# Altium schematic symbol library Sang_library.SchLib: 1607 symbols (part 14 of 15)
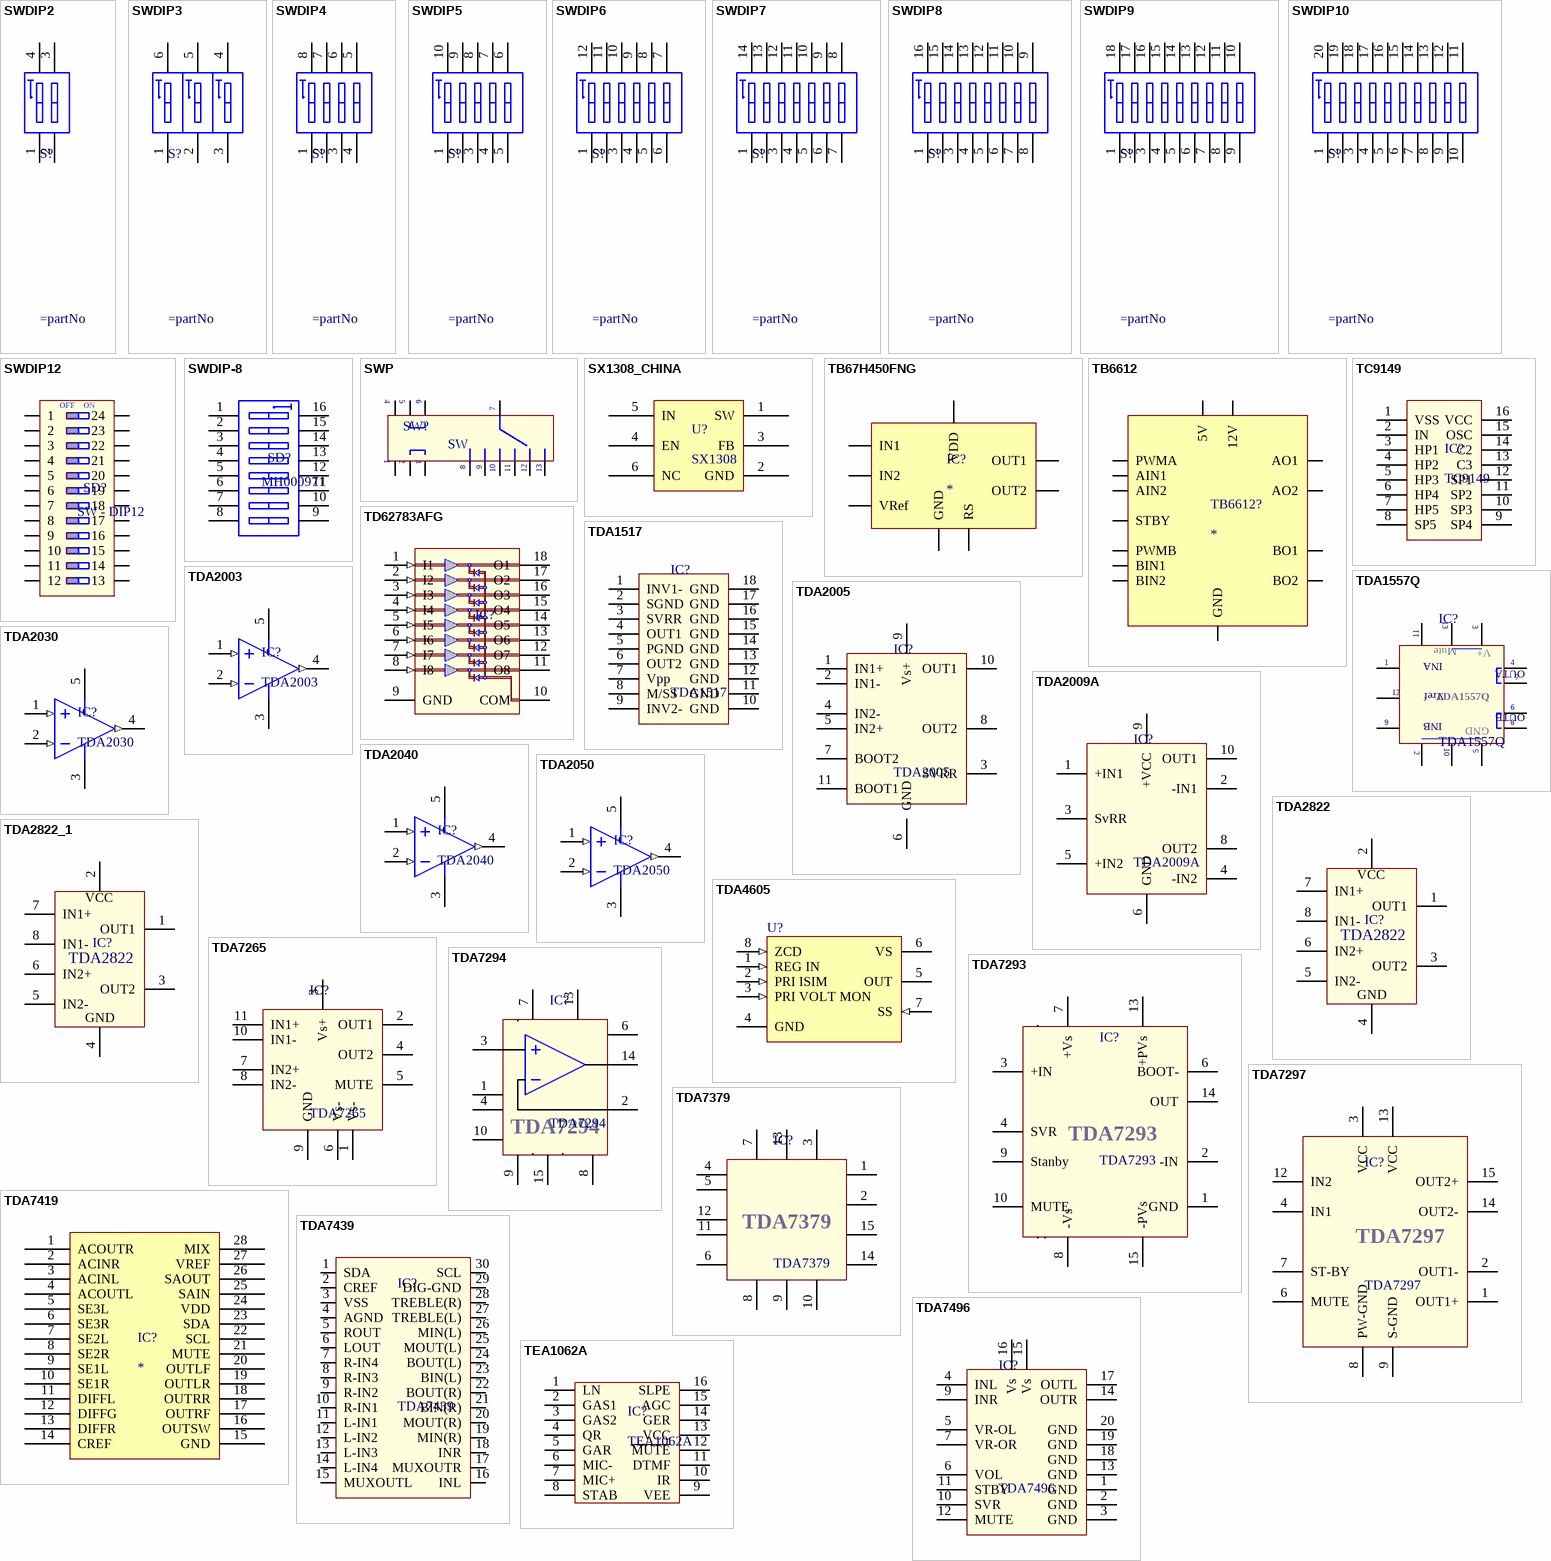
[diagram p110: symbols SWDIP2 to TEA1062A]

## SWDIP3
designator S?
WS-DITV 2.54 mm small compact THT flat actuator with top tape; Manufacturer: Wurth Elektronik; Part No.: 418127160901; ComponentLink1 Description: Manufacturer; ComponentLink2 Description: Datasheet; Pole: 01; Created Date: Dec.2015; ComponentLink1URL: http://www.we-online.com; ComponentLink2URL: http://katalog.we-online.de/em/datasheet/4181271609xx.pdf; Created by: Baojun Chen
footprint SW-DIP3 (03p, 2.54mm Pitch, Horizontal, IC Type, THT, raised Actuator, black, without Tape, Tube)
footprint SW-DIP3-1 (03p, 2.54mm Pitch, Horizontal, Box Type, THT, flat Actuator, red, without Tape, Tube)
pins: 1, 2, 3, 4, 5, 6

## SWDIP4
designator S?
WS-DITV 2.54 mm small compact THT flat actuator with top tape; Manufacturer: Wurth Elektronik; Part No.: 418127160904; ComponentLink1 Description: Manufacturer; ComponentLink2 Description: Datasheet; Pole: 04; Created Date: Dec.2015; ComponentLink1URL: http://www.we-online.com; ComponentLink2URL: http://katalog.we-online.de/em/datasheet/4181271609xx.pdf; Created by: Baojun Chen
footprint SW-DIP4 (04p, 2.54mm Pitch, Horizontal, Box Type, THT, flat Actuator, red, without Tape, Tube)
footprint SW-DIP4-1 (08p, 2.54mm Pitch, Horizontal, IC Type, THT, raised Actuator, black, without Tape, Tube)
pins: 1, 2, 3, 4, 5, 6, 7, 8

## SWDIP5
designator S?
WS-DITV 2.54 mm small compact THT flat actuator with top tape; Manufacturer: Wurth Elektronik; Part No.: 418127160905; ComponentLink1 Description: Manufacturer; ComponentLink2 Description: Datasheet; Pole: 05; Created Date: Dec.2015; ComponentLink1URL: http://www.we-online.com; ComponentLink2URL: http://katalog.we-online.de/em/datasheet/4181271609xx.pdf; Created by: Baojun Chen
footprint SW-DIP5 (05p, 2.54mm Pitch, Horizontal, Box Type, THT, flat Actuator, red, without Tape, Tube)
pins: 1, 2, 3, 4, 5, 6, 7, 8, 9, 10

## SWDIP6
designator S?
WS-DITV 2.54 mm small compact THT flat actuator with top tape; Manufacturer: Wurth Elektronik; Part No.: 418127160906; ComponentLink1 Description: Manufacturer; ComponentLink2 Description: Datasheet; Pole: 06; Created Date: Dec.2015; ComponentLink1URL: http://www.we-online.com; ComponentLink2URL: http://katalog.we-online.de/em/datasheet/4181271609xx.pdf; Created by: Baojun Chen
footprint SW-DIP6 (06p, 2.54mm Pitch, Horizontal, Box Type, THT, flat Actuator, red, without Tape, Tube)
pins: 1, 2, 3, 4, 5, 6, 7, 8, 9, 10, 11, 12

## SWDIP7
designator S?
WS-DITV 2.54 mm small compact THT flat actuator with top tape; Manufacturer: Wurth Elektronik; Part No.: 418127160907; ComponentLink1 Description: Manufacturer; ComponentLink2 Description: Datasheet; Pole: 07; Created Date: Dec.2015; ComponentLink1URL: http://www.we-online.com; ComponentLink2URL: http://katalog.we-online.de/em/datasheet/4181271609xx.pdf; Created by: Baojun Chen
footprint SW-DIP7 (07p, 2.54mm Pitch, Horizontal, IC Type, THT, raised Actuator, black, without Tape, Tube)
footprint SW-DIP7-1 (07p, 2.54mm Pitch, Horizontal, Box Type, THT, flat Actuator, red, without Tape, Tube)
pins: 1, 2, 3, 4, 5, 6, 7, 8, 9, 10, 11, 12, 13, 14

## SWDIP8
designator S?
WS-DITV 2.54 mm small compact THT flat actuator with top tape; Manufacturer: Wurth Elektronik; Part No.: 418127160908; ComponentLink1 Description: Manufacturer; ComponentLink2 Description: Datasheet; Pole: 08; Created Date: Dec.2015; ComponentLink1URL: http://www.we-online.com; ComponentLink2URL: http://katalog.we-online.de/em/datasheet/4181271609xx.pdf; Created by: Baojun Chen
footprint SW-DIP8 (16 PIN, W 300mil, Pin to pin 100mil For Switch)
pins: 1, 2, 3, 4, 5, 6, 7, 8, 9, 10, 11, 12, 13, 14, 15, 16

## SWDIP9
designator S?
WS-DITV 2.54 mm small compact THT flat actuator with top tape; Manufacturer: Wurth Elektronik; Part No.: 418127160909; ComponentLink1 Description: Manufacturer; ComponentLink2 Description: Datasheet; Pole: 09; Created Date: Dec.2015; ComponentLink1URL: http://www.we-online.com; ComponentLink2URL: http://katalog.we-online.de/em/datasheet/4181271609xx.pdf; Created by: Baojun Chen
footprint SW-DIP9-1 (09p, 2.54mm Pitch, Horizontal, Box Type, THT, flat Actuator, red, without Tape, Tube)
footprint SW-DIP9 (09p, 2.54mm Pitch, Horizontal, IC Type, THT, raised Actuator, black, without Tape, Tube)
pins: 1, 2, 3, 4, 5, 6, 7, 8, 9, 10, 11, 12, 13, 14, 15, 16, 17, 18

## SWDIP10
designator S?
WS-DITV 2.54 mm small compact THT flat actuator with top tape; Manufacturer: Wurth Elektronik; Part No.: 418127160910; ComponentLink1 Description: Manufacturer; ComponentLink2 Description: Datasheet; Pole: 10; Created Date: Dec.2015; ComponentLink1URL: http://www.we-online.com; ComponentLink2URL: http://katalog.we-online.de/em/datasheet/4181271609xx.pdf; Created by: Baojun Chen
footprint SW-DIP10-1 (10p, 2.54mm Pitch, Horizontal, IC Type, THT, raised Actuator, black, without Tape, Tube)
footprint SW-DIP10 (10p, 2.54mm Pitch, Horizontal, Box Type, THT, flat Actuator, red, without Tape, Tube)
pins: 1, 2, 3, 4, 5, 6, 7, 8, 9, 10, 11, 12, 13, 14, 15, 16, 17, 18, 19, 20

## SWDIP12
designator SD?, comment SW - DIP12
DIP Switch, 12 Position, SPST; Value: SW - DIP12
footprint SW-DIP12 (12p, 2.54mm Pitch, Horizontal, Box Type, THT, flat Actuator, red, without Tape, Tube)
pins: 1, 2, 3, 4, 5, 6, 7, 8, 9, 10, 11, 12, 13, 14, 15, 16, 17, 18, 19, 20, 21, 22, 23, 24
text: OFF; ON

## SWDIP-8
designator SD?, comment MH000971
Cắm; Value: Switch Số 8P ( Công Tắc Bit 8P)
footprint DIP16/W0.3 KEY (16 PIN, W 300mil, Pin to pin 100mil)
simulation model dpsw8 (Spice Subcircuit)
pins: 1 A1, 2 A2, 3 A3, 4 A4, 5 A5, 6 A6, 7 A7, 8 A8, 9 B8, 10 B7, 11 B6, 12 B5, 13 B4, 14 B3, 15 B2, 16 B1

## SWP
designator SW?, comment SW
Switch Power; Value: SW Power
footprint SWP (SW Power)
pins: 1, 2, 3, 4, 5, 6, 7, 8, 9, 10, 11, 12, 13

## SX1308_CHINA
designator U?, comment SX1308
footprint SOT23-6
pins: 1 SW (power), 2 GND (power), 3 FB (power), 4 EN (power), 5 IN (power), 6 NC (power)

## TB67H450FNG
designator IC?
footprint HSOP8 (SOIC, 8-Leads, Body 4.9x3.9mm, Pitch 1.27mm, IPC High Density)
pins: 1 GND, 2 IN2, 3 IN1, 4 VRef, 5 VDD, 6 OUT1, 7 RS, 8 OUT2

## TB6612
designator TB6612?
footprint TB6612
pins: 5V, 12V, AIN1, AIN2, AO1, AO2, BIN1, BIN2, BO1, BO2, GND, PWMA, PWMB, STBY

## TC9149
designator IC?
footprint DIP16
footprint SO16 (SOIC, 16-Leads, Body 9.90x3.91mm, Pitch 1.27mm, IPC Medium Density)
pins: 1 VSS, 2 IN, 3 HP1, 4 HP2, 5 HP3, 6 HP4, 7 HP5, 8 SP5, 9 SP4, 10 SP3, 11 SP2, 12 SP1, 13 C3, 14 C2, 15 OSC, 16 VCC

## TD62783AFG
designator IC?  (value not drawn)
High-Voltage, High-Current Darlington Array; Value: TD62783AFG
footprint DIP18 (DIP; 18 Leads; Row Spacing 7.62 mm; Pitch 2.54 mm)
footprint SO18 (SOIC, 18-Leads, Body 11.6x7.5mm, Pitch 1.27mm, IPC High Density)
pins: 1 I1 (in), 2 I2 (in), 3 I3 (in), 4 I4 (in), 5 I5 (in), 6 I6 (in), 7 I7 (in), 8 I8 (in), 9 GND (power), 10 COM, 11 O8 (oc), 12 O7 (oc), 13 O6 (oc), 14 O5 (oc), 15 O4 (oc), 16 O3 (oc), 17 O2 (oc), 18 O1 (oc)

## TDA1517
designator IC?
Value: TDA1557Q
footprint DIP18 (DIP; 18 Leads; Row Spacing 7.62 mm; Pitch 2.54 mm)
pins: 1 INV1-, 2 SGND, 3 SVRR, 4 OUT1, 5 PGND, 6 OUT2, 7 Vpp, 8 M/SS, 9 INV2-, 10 GND, 11 GND, 12 GND, 13 GND, 14 GND, 15 GND, 16 GND, 17 GND, 18 GND

## TDA1557Q
designator IC?
2 x 22 W BTL stereo car radio power amplifier with speaker protection; Value: TDA1557Q
footprint DIP13
pins: 1 IN1, 2 GND, 3 V+, 4 OUT1A, 5 GND, 6 OUT1B, 7 OUT2A, 8 OUT2B, 9 IN2, 10 GND, 11 Mute, 12 Vref, 13 V+
text: INA; OUTA; OUTB; INB

## TDA2003
designator IC?
10W CAR RADIO AUDIO AMPLIFIER; Value: TDA2003
footprint DIP5
footprint DIP5-T
pins: 1 IN+ (in), 2 IN- (in), 3 V- (power), 4 OUT (out), 5 V+ (power)

## TDA2005
designator IC?
Value: TDA1557Q
footprint DIP11
pins: 1 IN1+, 2 IN1-, 3 SVRR, 4 IN2-, 5 IN2+, 6 GND, 7 BOOT2, 8 OUT2, 9 Vs+, 10 OUT1, 11 BOOT1

## TDA2009A
designator IC?
2 x 10 W BTL stereo car radio power amplifier with speaker protection; Value: TDA1557Q
footprint DIP11
pins: 1 +IN1, 2 -IN1, 3 SvRR, 4 -IN2, 5 +IN2, 6 GND, 8 OUT2, 9 +VCC, 10 OUT1

## TDA2030
designator IC?
14W Hi-Fi AUDIO AMPLIFIER; Value: TDA2030
footprint DIP5
pins: 1 IN+ (in), 2 IN- (in), 3 V- (power), 4 OUT (out), 5 V+ (power)

## TDA2040
designator IC?
14W Hi-Fi AUDIO AMPLIFIER; Value: TDA2030
footprint DIP5
pins: 1 IN+ (in), 2 IN- (in), 3 V- (power), 4 OUT (out), 5 V+ (power)

## TDA2050
designator IC?
Value: TDA2030
footprint DIP5
pins: 1 IN+ (in), 2 IN- (in), 3 V- (power), 4 OUT (out), 5 V+ (power)

## TDA2822
designator IC?, comment MH001571  (value not drawn)
Cắm; Value: TDA2822 12V
footprint DIP8/W0.3 (8 PIN, W 300mil, Pin to pin 100mil)
pins: 1 OUT1, 2 VCC, 3 OUT2, 4 GND "VCC", 5 IN2- "VCC", 6 IN2+ "VCC", 7 IN1+ "VCC", 8 IN1- "VCC"

## TDA2822_1
designator IC?, comment TDA2822  (value not drawn)
Dual Low Voltage Power Amplifire
footprint DIP8
footprint SO8
pins: 1 OUT1, 2 VCC, 3 OUT2, 4 GND "VCC", 5 IN2- "VCC", 6 IN2+ "VCC", 7 IN1+ "VCC", 8 IN1- "VCC"

## TDA4605
designator U?
Control Circuit for Switch Mode Power Supplie using MOS Transistors; Published: 24-Aug-2001; LatestRevisionDate: 06-Jun-2005; LatestRevisionNote: Stylized 3D Model Added.; DatasheetVersion: Apr-1996; PackageReference: DIP8; Publisher: Altium Limited; PackageDescription: DIP; 8 Leads; Row Spacing 7.62 mm; Pitch 2.54 mm; Code_JEDEC: MO-001-AN; ComponentLink1Description: Manufacturer Link; ComponentLink1URL: http://www.st.com/; ComponentLink2Description: Datasheet; ComponentLink2URL: http://www.st.com/stonline/products/literature/ds/9775/tda4605.pdf
footprint DIP8
footprint SO8 (SOIC, 8-Leads, Body 4.9x3.9mm, Pitch 1.27mm, IPC High Density)
pins: 1 REG IN (in), 2 PRI ISIM (in), 3 PRI VOLT MON (in), 4 GND (power), 5 OUT (power), 6 VS (power), 7 SS (in), 8 ZCD (in)

## TDA7265
designator IC?
Value: TDA1557Q
footprint DIP11
pins: 1 Vs-, 2 OUT1, 3 Vs+, 4 OUT2, 5 MUTE, 6 Vs-, 7 IN2+, 8 IN2-, 9 GND, 10 IN1-, 11 IN1+

## TDA7293
designator IC?
100V - 100W DMOS AUDIO AMPLIFIER WITH MUTE/ST-BY; Value: TDA1557Q
footprint DIP15SL2
footprint DIP15
pins: 1 GND, 2 -IN, 3 +IN, 4 SVR, 5 NC, 6 BOOT-, 7 +Vs, 8 -Vs, 9 Stanby, 10 MUTE, 11 NC, 12 NC, 13 +PVs, 14 OUT, 15 -PVs

## TDA7294
designator IC?
100V - 100W DMOS AUDIO AMPLIFIER WITH MUTE/ST-BY; Value: TDA1557Q
footprint DIP15SL2
footprint DIP15
pins: 1, 2, 3, 4, 5 NC, 6, 7, 8, 9, 10, 11 NC, 12 NC, 13, 14, 15

## TDA7297
designator IC?
100V - 100W DMOS AUDIO AMPLIFIER WITH MUTE/ST-BY; Value: TDA1557Q
footprint DIP15SL2
footprint DIP15
pins: 1 OUT1+, 2 OUT1-, 3 VCC, 4 IN1, 6 MUTE, 7 ST-BY, 8 PW-GND, 9 S-GND, 12 IN2, 13 VCC, 14 OUT2-, 15 OUT2+

## TDA7379
designator IC?
100V - 100W DMOS AUDIO AMPLIFIER WITH MUTE/ST-BY; Value: TDA1557Q
footprint DIP15SL2
footprint DIP15
pins: 1, 2, 3, 4, 5, 6, 7, 8, 9, 10, 11, 12, 13, 14, 15

## TDA7419
designator IC?
footprint SO28 (SOIC, 28-Leads, Body 18.00x7.50mm, Pitch 1.27mm, IPC Medium Density)
pins: 1 ACOUTR, 2 ACINR, 3 ACINL, 4 ACOUTL, 5 SE3L, 6 SE3R, 7 SE2L, 8 SE2R, 9 SE1L, 10 SE1R, 11 DIFFL, 12 DIFFG, 13 DIFFR, 14 CREF, 15 GND, 16 OUTSW, 17 OUTRF, 18 OUTRR, 19 OUTLR, 20 OUTLF, 21 MUTE, 22 SCL, 23 SDA, 24 VDD, 25 SAIN, 26 SAOUT, 27 VREF, 28 MIX

## TDA7439
designator IC?
100V - 100W DMOS AUDIO AMPLIFIER WITH MUTE/ST-BY; Value: TDA1557Q
footprint SDIP30
pins: 1 SDA, 2 CREF, 3 VSS, 4 AGND, 5 ROUT, 6 LOUT, 7 R-IN4, 8 R-IN3, 9 R-IN2, 10 R-IN1, 11 L-IN1, 12 L-IN2, 13 L-IN3, 14 L-IN4, 15 MUXOUTL, 16 INL, 17 MUXOUTR, 18 INR, 19 MIN(R), 20 MOUT(R), 21 BIN(R), 22 BOUT(R), 23 BIN(L), 24 BOUT(L), 25 MOUT(L), 26 MIN(L), 27 TREBLE(L), 28 TREBLE(R), 29 DIG-GND, 30 SCL

## TDA7496
designator IC?
Value: TDA1557Q
footprint DIP20 (DIP 20, 20 PIN, W 300mil, Pin to pin 100mil)
pins: 1 GND, 2 GND, 3 GND, 4 INL, 5 VR-OL, 6 VOL, 7 VR-OR, 9 INR, 10 SVR, 11 STBY, 12 MUTE, 13 GND, 14 OUTR, 15 Vs, 16 Vs, 17 OUTL, 18 GND, 19 GND, 20 GND

## TEA1062A
designator IC?
Low voltage transmission circuits with dialler interface; Creat by: VanDungEvn@Gmail.com
footprint DIP16
footprint SO16 (SOIC, 16-Leads, Body 9.90x3.91mm, Pitch 1.27mm, IPC Medium Density)
pins: 1 LN, 2 GAS1, 3 GAS2, 4 QR, 5 GAR, 6 MIC-, 7 MIC+, 8 STAB, 9 VEE, 10 IR, 11 DTMF, 12 ~{MUTE}, 13 VCC, 14 GER, 15 AGC, 16 SLPE

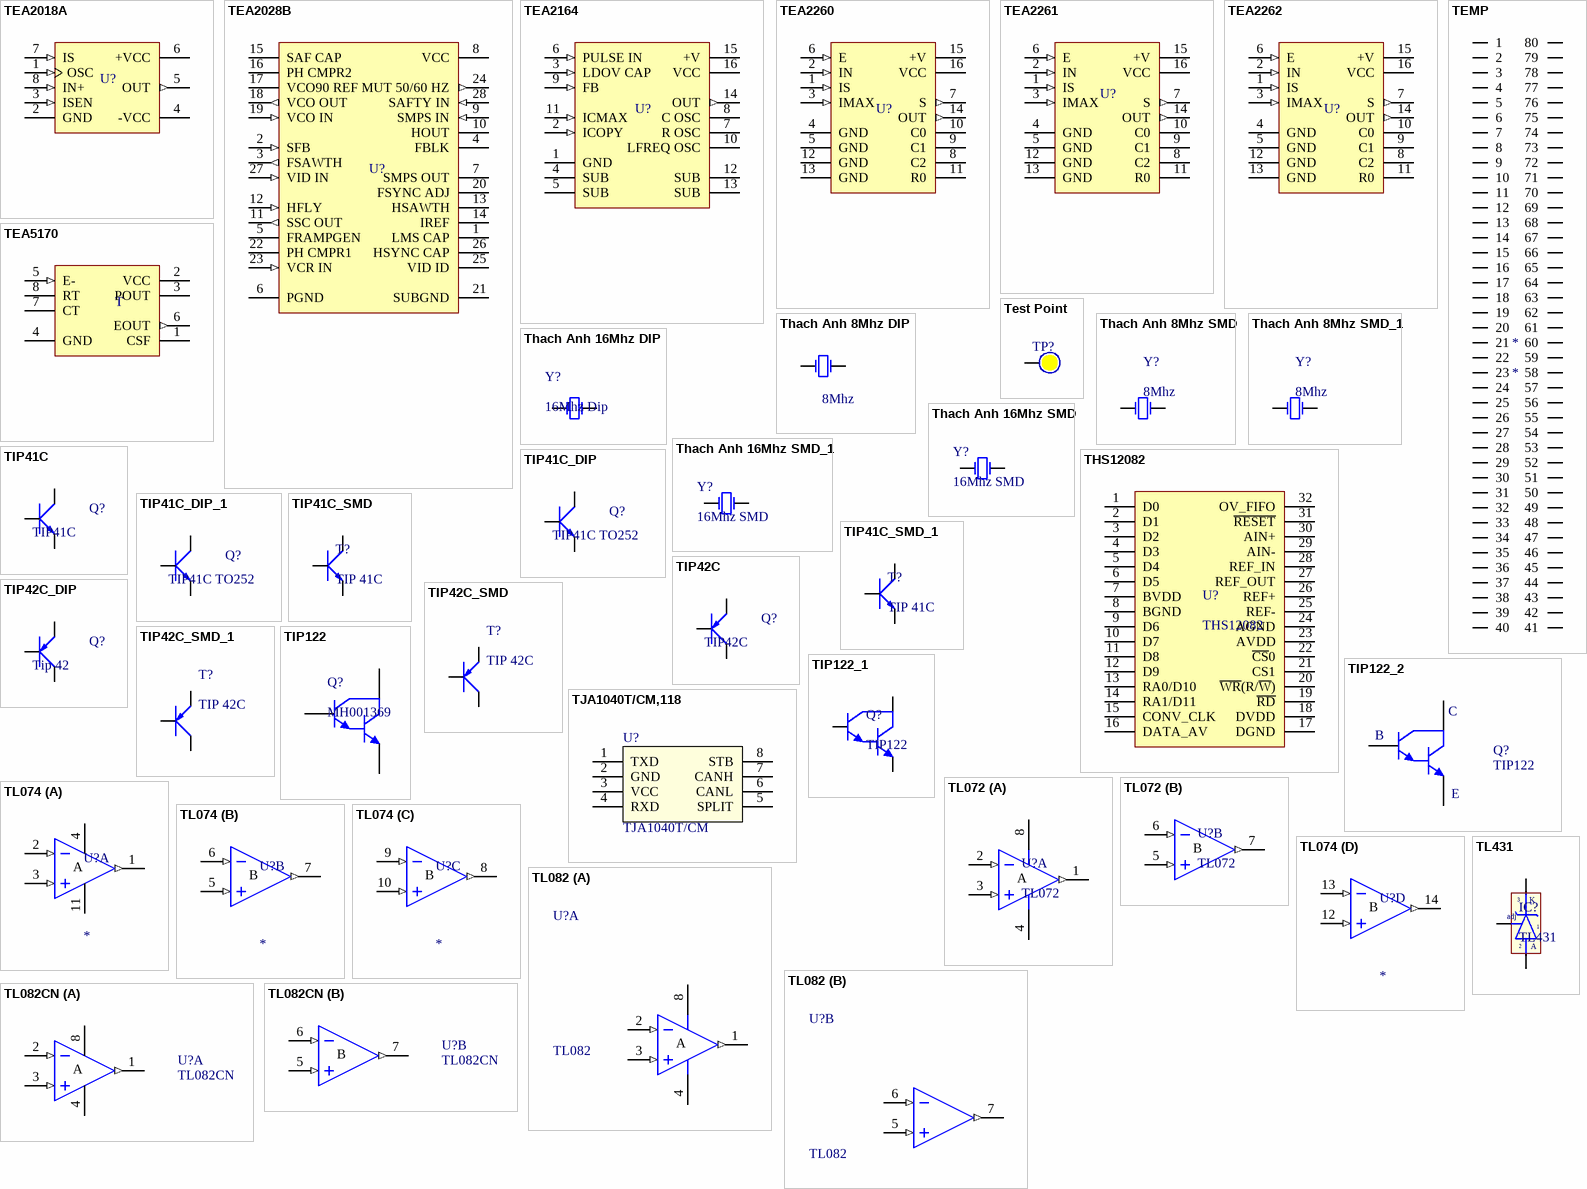
[diagram p91: symbols TEA2018A to TL431]

## TEA2018A
designator U?
Current Mode Switching Power Supply Control Circuit; Published: 24-Aug-2001; LatestRevisionDate: 06-Jun-2005; LatestRevisionNote: Stylized 3D Model Added.; DatasheetVersion: May-1993; PackageReference: DIP8; Publisher: Altium Limited; PackageDescription: DIP; 8 Leads; Row Spacing 7.62 mm; Pitch 2.54 mm; Code_JEDEC: MO-001-AN; ComponentLink1Description: Manufacturer Link; ComponentLink1URL: http://www.st.com/
footprint DIP8 (DIP; 8 Leads; Row Spacing 7.62 mm; Pitch 2.54 mm)
footprint SO8 (SOIC, 8-Leads, Body 4.9x3.9mm, Pitch 1.27mm, IPC High Density)
pins: 1 OSC (in), 2 GND (power), 3 ISEN (in), 4 -VCC (power), 5 OUT (out), 6 +VCC (power), 7 IS (in), 8 IN+ (in)

## TEA2028B
designator U?
Color TV Scanning and Power Supply Processor; Published: 24-Aug-2001; LatestRevisionDate: 06-Jun-2005; LatestRevisionNote: Stylized 3D Model Added.; DatasheetVersion: Aug-1993; PackageVersion: Jan-2003; PackageReference: PDIP28; Publisher: Altium Limited; PackageDescription: DIP; 28 Leads; Row Spacing 15.24 mm; Pitch 2.54 mm; ComponentLink1Description: Manufacturer Link; ComponentLink1URL: http://www.st.com/
footprint DIP28/W0.6 (DIP28/W.600, Pin to pin 100mil)
pins: 1 LMS CAP, 2 SFB (in), 3 FSAWTH (out), 4 FBLK (oc), 5 FRAMPGEN, 6 PGND (power), 7 SMPS OUT (oe), 8 VCC (power), 9 SMPS IN (in), 10 HOUT (oc), 11 SSC OUT (out), 12 HFLY (in), 13 HSAWTH, 14 IREF, 15 SAF CAP, 16 PH CMPR2, 17 VCO90 REF, 18 VCO OUT (out), 19 VCO IN (in), 20 FSYNC ADJ, 21 SUBGND (power), 22 PH CMPR1, 23 VCR IN (in), 24 MUT 50/60 HZ (out), 25 VID ID, 26 HSYNC CAP, 27 VID IN (in), 28 SAFTY IN (in)

## TEA2164
designator U?
Switch Mode Power Supply Primary Circuit; Published: 24-Aug-2001; LatestRevisionDate: 06-Jun-2005; LatestRevisionNote: Stylized 3D Model Added.; DatasheetVersion: Dec-1992; PackageVersion: Apr-1996; PackageReference: DIP16; Publisher: Altium Limited; PackageDescription: DIP; 16 Leads; Row Spacing 7.62 mm; Pitch 2.54 mm; ComponentLink1Description: Manufacturer Link; ComponentLink1URL: http://www.st.com/
footprint DIP16 (DIP; 16 Leads; Row Spacing 7.62 mm; Pitch 2.54 mm)
pins: 1 GND (power), 2 ICOPY (in), 3 LDOV CAP (in), 4 SUB (power), 5 SUB (power), 6 PULSE IN (in), 7 R OSC, 8 C OSC, 9 FB (in), 10 LFREQ OSC, 11 ICMAX (in), 12 SUB (power), 13 SUB (power), 14 OUT (out), 15 +V (power), 16 VCC (power)

## TEA2260
designator U?
Switch Mode Power Supply Controller; Published: 24-Aug-2001; LatestRevisionDate: 06-Jun-2005; LatestRevisionNote: Stylized 3D Model Added.; DatasheetVersion: Jun-1992; PackageVersion: Apr-1996; PackageReference: DIP16; Publisher: Altium Limited; PackageDescription: DIP; 16 Leads; Row Spacing 7.62 mm; Pitch 2.54 mm; ComponentLink1Description: Manufacturer Link; ComponentLink1URL: http://www.st.com/; ComponentLink2Description: Datasheet; ComponentLink2URL: http://www.st.com/stonline/products/literature/ds/9953/tea2261.pdf
footprint DIP16 (DIP; 16 Leads; Row Spacing 7.62 mm; Pitch 2.54 mm)
pins: 1 IS (in), 2 IN (in), 3 IMAX (in), 4 GND (power), 5 GND (power), 6 E (in), 7 S (out), 8 C2, 9 C1, 10 C0, 11 R0, 12 GND (power), 13 GND (power), 14 OUT (out), 15 +V (power), 16 VCC (power)

## TEA2261
designator U?
Switch Mode Power Supply Controller; Published: 24-Aug-2001; LatestRevisionDate: 06-Jun-2005; LatestRevisionNote: Stylized 3D Model Added.; DatasheetVersion: Jun-1992; PackageVersion: Apr-1996; PackageReference: DIP16; Publisher: Altium Limited; PackageDescription: DIP; 16 Leads; Row Spacing 7.62 mm; Pitch 2.54 mm; ComponentLink1Description: Manufacturer Link; ComponentLink1URL: http://www.st.com/; ComponentLink2Description: Datasheet; ComponentLink2URL: http://www.st.com/stonline/products/literature/ds/9953/tea2261.pdf
footprint DIP16 (DIP; 16 Leads; Row Spacing 7.62 mm; Pitch 2.54 mm)
pins: 1 IS (in), 2 IN (in), 3 IMAX (in), 4 GND (power), 5 GND (power), 6 E (in), 7 S (out), 8 C2, 9 C1, 10 C0, 11 R0, 12 GND (power), 13 GND (power), 14 OUT (out), 15 +V (power), 16 VCC (power)

## TEA2262
designator U?
Switch Mode Power Supply Controller; Published: 24-Aug-2001; LatestRevisionDate: 06-Jun-2005; LatestRevisionNote: Stylized 3D Model Added.; DatasheetVersion: Apr-1996; PackageVersion: Apr-1996; PackageReference: DIP16; Publisher: Altium Limited; PackageDescription: DIP; 16 Leads; Row Spacing 7.62 mm; Pitch 2.54 mm; ComponentLink1Description: Manufacturer Link; ComponentLink1URL: http://www.st.com/; ComponentLink2Description: Datasheet; ComponentLink2URL: http://www.st.com/stonline/products/literature/ds/10453/tea2262.pdf
footprint DIP16 (DIP; 16 Leads; Row Spacing 7.62 mm; Pitch 2.54 mm)
pins: 1 IS (in), 2 IN (in), 3 IMAX (in), 4 GND (power), 5 GND (power), 6 E (in), 7 S (out), 8 C2, 9 C1, 10 C0, 11 R0, 12 GND (power), 13 GND (power), 14 OUT (out), 15 +V (power), 16 VCC (power)

## TEA5170
designator T
Switch Mode Power Supply Secondary Circuit; Published: 24-Aug-2001; LatestRevisionDate: 06-Jun-2005; LatestRevisionNote: Stylized 3D Model Added.; DatasheetVersion: Sep-1993; PackageReference: DIP8; Publisher: Altium Limited; PackageDescription: DIP; 8 Leads; Row Spacing 7.62 mm; Pitch 2.54 mm; Code_JEDEC: MO-001-AN; ComponentLink1Description: Manufacturer Link; ComponentLink1URL: http://www.st.com/
footprint DIP8 (DIP; 8 Leads; Row Spacing 7.62 mm; Pitch 2.54 mm)
pins: 1 CSF, 2 VCC (power), 3 POUT (power), 4 GND (power), 5 E- (in), 6 EOUT (out), 7 CT, 8 RT

## TEMP
designator *
pins: 1, 2, 3, 4, 5, 6, 7, 8, 9, 10, 11, 12, 13, 14, 15, 16, 17, 18, 19, 20, 21, 22, 23, 24, 25, 26, 27, 28, 29, 30, 31, 32, 33, 34, 35, 36, 37, 38, 39, 40, 41, 42, 43, 44, 45, 46, 47, 48, 49, 50, 51, 52, 53, 54, 55, 56, 57, 58, 59, 60, 61, 62, 63, 64, 65, 66, 67, 68, 69, 70, 71, 72, 73, 74, 75, 76, 77, 78, 79, 80

## Test Point
designator TP?  (no BOM)
Test Point; Solder: NF
footprint Test Point 1 Side
footprint Test Point 2 Side
footprint Test Point 1 MM
footprint Test Point 2 Side - 2MM (Test Point 2 Side)
pins: 0

## Thach Anh 8Mhz DIP
designator Y?, comment 8Mhz
Cắm; Don_Vi: Con; Ghi_Chu: *; Ma_Hang: *; Kieu_CHan: *; Chung_Loai: Cắm
footprint XT2N (Crystal 2pin, high 200 mil)
footprint XT455kn (Thach anh 455khz (Infrared))
footprint XT455k (Thach anh 455khz (Infrared))
footprint XT32kn (Crystal for 32,768kHz, 2pin)
footprint XT2 (Footpin for Crystal 2 pin)
footprint xtal (thach anh dan loai nho)
pins: 1 OSC1, 2 OSC2

## Thach Anh 8Mhz SMD
designator Y?, comment 8Mhz
Dán; Don_Vi: Con; Ma_Hang: MH005038; Ten_Linh_Kien: Thạch Anh 8Mhz SMD5032; Ghi_Chu: *; Kieu_Chan: *; Chung_Loai: Dán
pins: 1 OSC1, 2 OSC2

## Thach Anh 8Mhz SMD_1
designator Y?, comment 8Mhz
Dán; Don_Vi: Con; Ma_Hang: MH005038; Ten_Linh_Kien: Thạch Anh 8Mhz SMD5032; Ghi_Chu: *; Kieu_Chan: *; Chung_Loai: Dán
pins: 1 OSC1, 2 OSC2

## Thach Anh 16Mhz DIP
designator Y?, comment 16Mhz Dip
Cắm; Ma_Hang: MH003689; Don_Vi: Con; Ten_Linh_Kien: Thạch Anh 16Mhz 49S DIP; Ghi_Chu: *; Chung_Loai: Cắm; Kieu_Chan: *
pins: 1 OSC1, 2 OSC2

## Thach Anh 16Mhz SMD
designator Y?, comment 16Mhz SMD
Dán; Ten_Linh_Kien: Thạch Anh 16Mhz SMD5032; Ma_Hang: MH001979; Don_Vi: Con; Chung_Loai: Dán; Ghi_Chu: *; Kieu_Chan: *
pins: 1 OSC1, 2 OSC2

## Thach Anh 16Mhz SMD_1
designator Y?, comment 16Mhz SMD
Dán; Ten_Linh_Kien: Thạch Anh 16Mhz SMD5032; Ma_Hang: MH001979; Don_Vi: Con; Chung_Loai: Dán; Ghi_Chu: *; Kieu_Chan: *
pins: 1 OSC1, 2 OSC2

## THS12082
designator U?
footprint TSSOP32 (TSSOP, 32-Leads, Body 11.10x6.10mm, Pitch 0.65mm, IPC High Density)
pins: 1 D0, 2 D1, 3 D2, 4 D3, 5 D4, 6 D5, 7 BVDD, 8 BGND, 9 D6, 10 D7, 11 D8, 12 D9, 13 RA0/D10, 14 RA1/D11, 15 CONV_CLK, 16 DATA_AV, 17 DGND, 18 DVDD, 19 ~{RD}, 20 ~{WR}(R/~{W}), 21 CS1, 22 ~{CS}0, 23 AVDD, 24 AGND, 25 REF-, 26 REF+, 27 REF_OUT, 28 REF_IN, 29 AIN-, 30 AIN+, 31 ~{RESET}, 32 OV_FIFO

## TIP41C
designator Q?
NPN 2W, BCE; Value: TIP41C
footprint TO220-123 (TO-220 - 1-2-3)
footprint TO220H1 (TO-220 - 1-2-3)
footprint TO220H2 (TO-220 - 1-2-3)
footprint TO220H3 (TO-220 1-2-3)
pins: 1 B, 2 C, 3 E

## TIP41C_DIP
designator Q?, comment TIP41C TO252
Dán; Ten_Linh_Kien: TIP41C TO252 TRANS NPN 6A 100V ( J41C); Don_Vi: Con; Ma_Hang: MH005642; Chung_Loai: Cắm; Ghi_Chu: *; Kieu_Chan: *
footprint QTO-220 (TO-220 - 1-2-3)
pins: 1 B, 2 C, 3 E

## TIP41C_DIP_1
designator Q?, comment TIP41C TO252
Dán; Ten_Linh_Kien: TIP41C TO252 TRANS NPN 6A 100V ( J41C); Don_Vi: Con; Ma_Hang: MH005642; Chung_Loai: Cắm; Ghi_Chu: *; Kieu_Chan: *
footprint QTO-220 (TO-220 - 1-2-3)
pins: 1 B, 2 C, 3 E

## TIP41C_SMD
designator T?, comment TIP 41C
Dán; Don_Vi: Con; Ma_Hang: MH007260; Ten_Linh_Kien: TIP42C TO252 TRANS PNP 6A 100V (SMD-J42C); Chung_Loai: Dán; Kieu_Chan: *; Ghi_Chu: *
footprint TO252_NEW
pins: 1 B, 2 C, 3 E

## TIP41C_SMD_1
designator T?, comment TIP 41C
Dán; Don_Vi: Con; Ma_Hang: MH007260; Ten_Linh_Kien: TIP42C TO252 TRANS PNP 6A 100V (SMD-J42C); Chung_Loai: Dán; Kieu_Chan: *; Ghi_Chu: *
footprint TO252_NEW
pins: 1 B, 2 C, 3 E

## TIP42C
designator Q?
PNP 2W, BCE; Value: TIP42C
footprint TO220-123 (TO-220 - 1-2-3)
footprint TO220H1 (TO-220 - 1-2-3)
footprint TO220H2 (TO-220 - 1-2-3)
footprint TO220H3 (TO-220 1-2-3)
pins: 1 B, 2 C, 3 E

## TIP42C_DIP
designator Q?, comment Tip 42
Cắm; Ten_Linh_Kien: TIP42C TO220; Ma_Hang: MH001057; Don_Vi: Con; Kieu Chan: *; Ghi_Chu: *; Chung_Loai: Cắm
footprint QTO-220 (TO-220 - 1-2-3)
pins: 1 B, 2 C, 3 E

## TIP42C_SMD
designator T?, comment TIP 42C
Dán; Don_Vi: Con; Ma_Hang: MH007260; Ten_Linh_Kien: TIP42C TO252 TRANS PNP 6A 100V (SMD-J42C); Kieu_Chan: *; Ghi_Chu: *; Chung_Loai: Dán
footprint TO252_NEW
pins: 1 B, 2 C, 3 E

## TIP42C_SMD_1
designator T?, comment TIP 42C
Dán; Don_Vi: Con; Ma_Hang: MH007260; Ten_Linh_Kien: TIP42C TO252 TRANS PNP 6A 100V (SMD-J42C); Kieu_Chan: *; Ghi_Chu: *; Chung_Loai: Dán
footprint TO252_NEW
pins: 1 B, 2 C, 3 E

## TIP122
designator Q?, comment MH001369
Cắm; Value: TIP122 TO220 TRANS DarLingTon NPN 5A 100V
footprint QTO-220 (TO-220 - 1-2-3)
pins: 1 B, 2 C, 3 E

## TIP122_1
designator Q?, comment TIP122
Darlington Silicon Power NPN Transistor, 8 Amp, 100 Volts and 65 Watts
footprint TO220-123 (TO-220 - 1-2-3)
pins: 1 B, 2 C, 3 E

## TIP122_2
designator Q?, comment TIP122
TRANS NPN DARL 100V 5A TO-220; Solder: SMT; CompanyID: VT-00411; MPN: TIP122; Value: TIP122
footprint TO220
pins: 1 B, 2 C, 3 E

## TJA1040T/CM,118
designator U?, comment TJA1040T/CM
IC TRANSCEIVER CAN 8SOIC; MPN: TJA1040T/CM,118; Solder: SMT; Value: TJA1040T/CM; Category: IC
footprint SOIC-8
pins: 1 TXD, 2 GND, 3 VCC, 4 RXD, 5 SPLIT, 6 CANL, 7 CANH, 8 STB

## TL072
designator U?
footprint DIP8
footprint SO8 (SOIC, 8-Leads, Body 4.9x3.9mm, Pitch 1.27mm, IPC High Density)
part A pins: 1 OUT (out), 2 IN- (in), 3 IN+ (in), 4 V- (power), 8 V+ (power)
part B pins: 5 IN+ (in), 6 IN- (in), 7 OUT (out)
part A text: A
part B text: B

## TL074
designator U?
TL074
footprint SO14
footprint DIP14
part A pins: 1 OUT (out), 2 IN- (in), 3 IN+ (in), 4 V+ (power), 11 V- (power)
part B pins: 5 IN+ (in), 6 IN- (in), 7 OUT (out)
part C pins: 8 OUT (out), 9 IN- (in), 10 IN+ (in)
part D pins: 12 IN+ (in), 13 IN- (in), 14 OUT (out)
part A text: A
part B text: B
part C text: B
part D text: B

## TL082
designator U?
IC OPAMP JFET 2 CIRCUIT 8SO; MPN: TL082CDT; MFR: STM; Solder: SMT; Value: TL082; Category: IC; PinCount: 8
footprint SOIC-8
part A pins: 1 OUT (out), 2 IN- (in), 3 IN+ (in), 4 V- (power), 8 V+ (power)
part B pins: 5 IN+ (in), 6 IN- (in), 7 OUT (out)
part A text: A

## TL082CN
designator U?
General-Purpose J-FET Dual Operational Amplifier; Published: 24-Aug-2001; LatestRevisionDate: 06-Jun-2005; LatestRevisionNote: Stylized 3D Model Added.; DatasheetVersion: Jan-1999; PackageReference: DIP8; Publisher: Altium Limited; PackageDescription: DIP; 8 Leads; Row Spacing 7.62 mm; Pitch 2.54 mm; Code_JEDEC: MO-001-AN; ComponentLink1Description: Manufacturer Link; ComponentLink1URL: http://www.st.com/; ComponentLink2Description: Datasheet; ComponentLink2URL: http://www.st.com/stonline/products/literature/ds/2300/tl082.pdf
footprint DIP8
footprint SO8 (SOIC, 8-Leads, Body 4.9x3.9mm, Pitch 1.27mm, IPC High Density)
part A pins: 1 OUT (out), 2 IN- (in), 3 IN+ (in), 4, 8
part B pins: 5 IN+ (in), 6 IN- (in), 7 OUT (out)
part A text: A
part B text: B

## TL431
designator IC?
Programmable Shunt Regulator; Value: TL431
footprint TO92-123 (TO-92)
footprint SOT23-132
pins: 1 adj, 2 A, 3 K

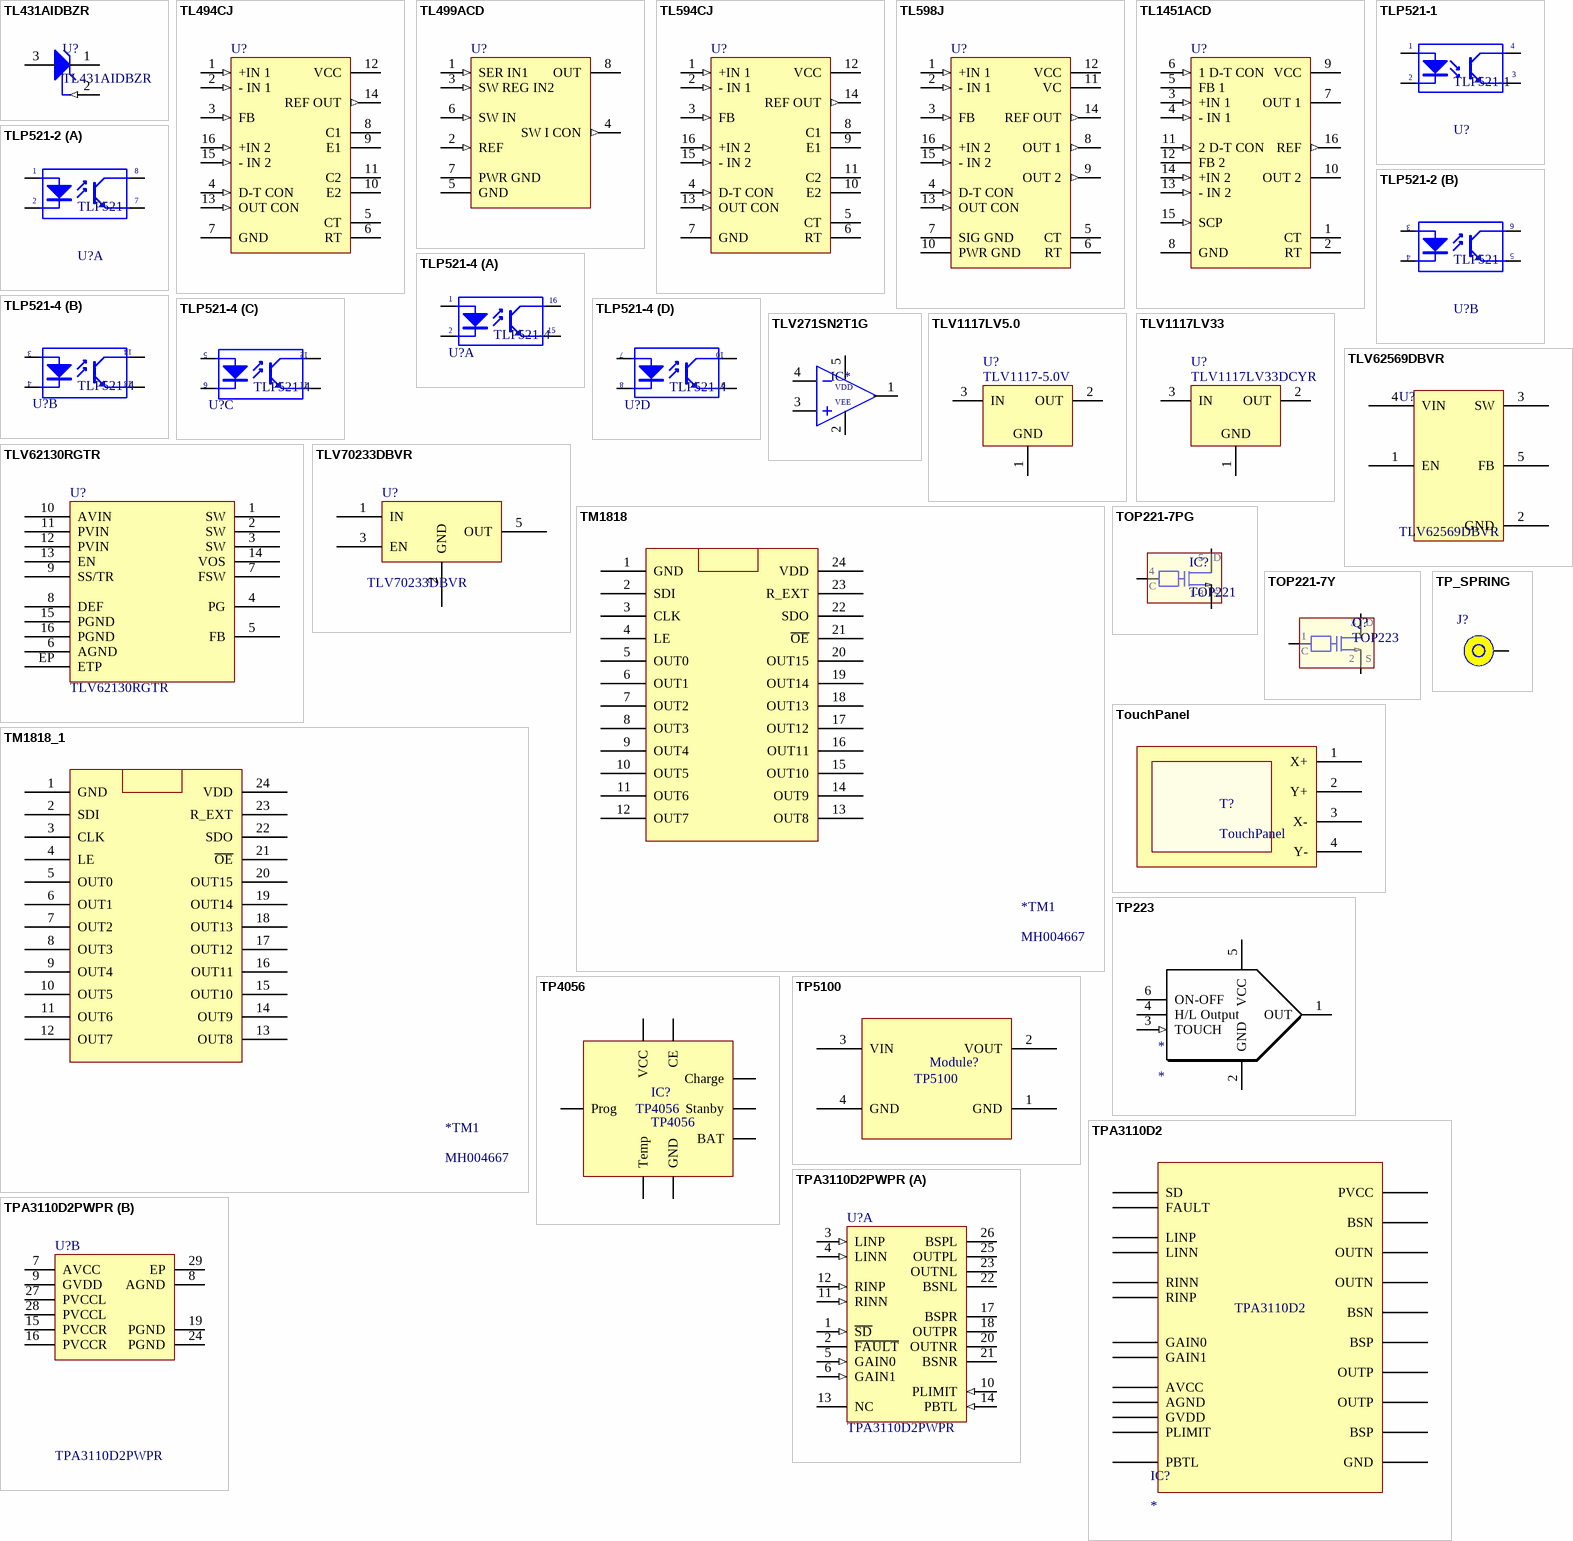
[diagram p92: symbols TL431AIDBZR to TPA3110D2PWPR]

## TL431AIDBZR
designator U?
IC VREF SHUNT ADJ SOT23-3; Solder: SMT; MPN: TL431AIDBZR; Value: TL431AIDBZR; Category: IC
footprint SOT23_3 (SOT23, 3-Leads, Body 2,90x2,30mm, Pitch 0,95mm, IPC Medium Density)
pins: 1 CATHODE, 2 REF (in), 3 ANODE

## TL494CJ
designator U?
Pulse-Width-Modulation Control Circuit; Published: 15-Apr-2002; LatestRevisionDate: 06-Jun-2005; LatestRevisionNote: Stylized 3D Model Added.; DatasheetVersion: Oct-1988; PackageVersion: Jun-1999; PackageReference: J016; Publisher: Altium Limited; PackageDescription: DIP; 16 Leads; Row Spacing 7.62 mm; Pitch 2.54 mm; ComponentLink1Description: Manufacturer Link; ComponentLink1URL: http://www.ti.com/
footprint DIP16
footprint SO16 (SOIC, 16-Leads, Body 9.90x3.91mm, Pitch 1.27mm, IPC Medium Density)
footprint TSOP16 (TSOP, 16-Leads, Body 5.10x4.40mm, Pitch 0.65mm, IPC High Density)
pins: 1 +IN 1 (in), 2 - IN 1 (in), 3 FB (in), 4 D-T CON (in), 5 CT, 6 RT, 7 GND (power), 8 C1, 9 E1, 10 E2, 11 C2, 12 VCC (power), 13 OUT CON (in), 14 REF OUT (out), 15 - IN 2 (in), 16 +IN 2 (in)

## TL499ACD
designator U?
Wide-Range Power Supply Controller; Published: 15-Apr-2002; LatestRevisionDate: 13-Apr-2006; LatestRevisionNote: IPC-7351 Footprint Added.; DatasheetVersion: Feb-1989; PackageVersion: Jan-1998; PackageReference: D008; Publisher: Altium Limited; PackageDescription: 8-Pin Small Outline Integrated Circuit 1.27 mm Pitch; Code_IPC: SOIC127P600-8; ComponentLink1Description: Manufacturer Link; ComponentLink1URL: http://www.ti.com/
footprint SSO8 (SSOIC, 8-Leads, Body 6.20x5.30mm, Pitch 1.27mm, IPC Medium Density)
footprint DIP8
pins: 1 SER IN1 (in), 2 REF (in), 3 SW REG IN2 (in), 4 SW I CON (out), 5 GND (power), 6 SW IN (in), 7 PWR GND (power), 8 OUT (power)

## TL594CJ
designator U?
Pulse-Width-Modulation Control Circuit; Published: 15-Apr-2002; LatestRevisionDate: 06-Jun-2005; LatestRevisionNote: Stylized 3D Model Added.; DatasheetVersion: Oct-1988; PackageVersion: Jun-1999; PackageReference: J016; Publisher: Altium Limited; PackageDescription: DIP; 16 Leads; Row Spacing 7.62 mm; Pitch 2.54 mm; ComponentLink1Description: Manufacturer Link; ComponentLink1URL: http://www.ti.com/
footprint DIP16
footprint SO16 (SOIC, 16-Leads, Body 9.90x3.91mm, Pitch 1.27mm, IPC Medium Density)
footprint TSOP16 (TSOP, 16-Leads, Body 5.10x4.40mm, Pitch 0.65mm, IPC High Density)
pins: 1 +IN 1 (in), 2 - IN 1 (in), 3 FB (in), 4 D-T CON (in), 5 CT, 6 RT, 7 GND (power), 8 C1, 9 E1, 10 E2, 11 C2, 12 VCC (power), 13 OUT CON (in), 14 REF OUT (out), 15 - IN 2 (in), 16 +IN 2 (in)

## TL598J
designator U?
Pulse-Width-Modulation Control Circuit; Published: 15-Apr-2002; LatestRevisionDate: 06-Jun-2005; LatestRevisionNote: Stylized 3D Model Added.; DatasheetVersion: Oct-1988; PackageVersion: Jun-1999; PackageReference: J016; Publisher: Altium Limited; PackageDescription: DIP; 16 Leads; Row Spacing 7.62 mm; Pitch 2.54 mm; ComponentLink1Description: Manufacturer Link; ComponentLink1URL: http://www.ti.com/
footprint SO16 (SOIC, 16-Leads, Body 9.90x3.91mm, Pitch 1.27mm, IPC Medium Density)
footprint DIP16
pins: 1 +IN 1 (in), 2 - IN 1 (in), 3 FB (in), 4 D-T CON (in), 5 CT, 6 RT, 7 SIG GND (power), 8 OUT 1 (out), 9 OUT 2 (out), 10 PWR GND (power), 11 VC (power), 12 VCC (power), 13 OUT CON (in), 14 REF OUT (out), 15 - IN 2 (in), 16 +IN 2 (in)

## TL1451ACD
designator U?
Dual Pulse-Width-Modulation Control Circuit; Published: 15-Apr-2002; LatestRevisionDate: 13-Apr-2006; LatestRevisionNote: IPC-7351 Footprint Added.; DatasheetVersion: Oct-1988; PackageVersion: Jan-1998; PackageReference: D016; Publisher: Altium Limited; PackageDescription: 16-Pin Small Outline Integrated Circuit 1.27 mm Pitch; Code_IPC: SOIC127P600-16; ComponentLink1Description: Manufacturer Link; ComponentLink1URL: http://www.ti.com/
footprint SO16 (SOIC, 16-Leads, Body 9.90x3.91mm, Pitch 1.27mm, IPC Medium Density)
footprint DIP16
pins: 1 CT, 2 RT, 3 +IN 1 (in), 4 - IN 1 (in), 5 FB 1, 6 1 D-T CON (in), 7 OUT 1 (oc), 8 GND (power), 9 VCC (power), 10 OUT 2 (oc), 11 2 D-T CON (in), 12 FB 2, 13 - IN 2 (in), 14 +IN 2 (in), 15 SCP (in), 16 REF (out)

## TLP521-1
designator U?
Single Opto; Value: TLP5211
footprint DIP4
pins: 1 A "Anode", 2 K "Cathode", 3 E "Emitter", 4 C "Collector"

## TLP521-2
designator U?, comment TLP521
Dual Opto; Value: TLP521-2
footprint DIP8
part A pins: 1 A "Anode", 2 K "Cathode", 7 E "Emitter", 8 C "Collector"
part B pins: 3 A "Anode", 4 K "Cathode", 5 E "Emitter", 6 C "Collector"

## TLP521-4
designator U?
Four Opto; Value: TLP521-4
footprint DIP16
part A pins: 1 A "Anode", 2 K "Cathode", 15 E "Emitter", 16 C "Collector"
part B pins: 3 A "Anode", 4 K "Cathode", 13 E "Emitter", 14 C "Collector"
part C pins: 5 A "Anode", 6 K "Cathode", 11 E "Emitter", 12 C "Collector"
part D pins: 7 A "Anode", 8 K "Cathode", 9 E "Emitter", 10 C "Collector"

## TLV271SN2T1G
designator IC*
footprint TSOP5
pins: 1, 2 -, 3, 4, 5 +
text: VDD; VEE

## TLV1117LV5.0
designator U?, comment TLV1117-5.0V
IC REG LINEAR 5V 800MA SOT223-4; MFR: Texas Instruments; MPN: TLV1117-50CDCYR; Solder: SMT; Value: TLV1117-50; Category: IC
footprint SOT-223-4
pins: 1 GND (power) "Ground pin", 2 OUT (power) "Regulated output voltage pin.", 3 IN (power) "Input pin."

## TLV1117LV33
designator U?, comment TLV1117LV33DCYR
Single Output LDO, 1 A, Fixed 3.3 V Output, 2 to 5.5 V Input, 4-pin SOT-223 (DCY), -40 to 125 degC, Green (RoHS & no Sb/Br); MFR: Texas Instruments; Solder: SMT; MPN: TLV1117LV33DCYR; Value: TLV1117LV33; Category: IC
footprint SOT-223-4
pins: 1 GND (power) "Ground pin", 2 OUT (power) "Regulated output voltage pin.", 3 IN (power) "Input pin."

## TLV62130RGTR
designator U?
IC REG BUCK ADJ 3A SYNC 16QFN; Solder: SMT; MPN: TLV62130RGTR; Value: TLV62130RGTR; Category: IC
footprint QFN16 30X30 (QFN, 16-Leads, Body 3.00x3.00mm, Pitch 0.50mm, Thermal Pad 1.70x1.70mm, IPC Medium Density)
pins: 1 SW, 2 SW, 3 SW, 4 PG, 5 FB, 6 AGND, 7 FSW, 8 DEF, 9 SS/TR, 10 AVIN, 11 PVIN, 12 PVIN, 13 EN, 14 VOS, 15 PGND, 16 PGND, EP ETP

## TLV62569DBVR
designator U?
IC REG BUCK ADJ 2A SOT23-5; MFR: Texas Instruments; Solder: SMT; MPN: TLV62569DBVR; Value: TLV62569DBVR; Category: IC; PinCount: 5
footprint SOT23-5
pins: 1 EN, 2 GND, 3 SW, 4 VIN, 5 FB

## TLV70233DBVR
designator U?
IC REG LDO 3.3V 0.3A SOT23-5; Solder: SMT; MPN: TLV70233DBVR; Value: TLV70233DBVR; Category: IC
footprint SOT23-5
pins: 1 IN, 2 GND, 3 EN, 5 OUT

## TM1818
designator *TM1, comment MH004667
Dán; Value: TM1818 SSOP24
footprint SSOP24 (SOP, 24-Leads, Body 13.1x6.1mm (max), Pitch 1.00mm, IPC Medium Density)
pins: 1 GND, 2 SDI, 3 CLK, 4 LE, 5 OUT0, 6 OUT1, 7 OUT2, 8 OUT3, 9 OUT4, 10 OUT5, 11 OUT6, 12 OUT7, 13 OUT8, 14 OUT9, 15 OUT10, 16 OUT11, 17 OUT12, 18 OUT13, 19 OUT14, 20 OUT15, 21 ~{OE}, 22 SDO, 23 R_EXT, 24 VDD

## TM1818_1
designator *TM1, comment MH004667
Dán; Value: TM1818 SSOP24
footprint SSOP24 (SOP, 24-Leads, Body 13.1x6.1mm (max), Pitch 1.00mm, IPC Medium Density)
pins: 1 GND, 2 SDI, 3 CLK, 4 LE, 5 OUT0, 6 OUT1, 7 OUT2, 8 OUT3, 9 OUT4, 10 OUT5, 11 OUT6, 12 OUT7, 13 OUT8, 14 OUT9, 15 OUT10, 16 OUT11, 17 OUT12, 18 OUT13, 19 OUT14, 20 OUT15, 21 ~{OE}, 22 SDO, 23 R_EXT, 24 VDD

## TOP221-7PG
designator IC?, comment TOP221
Family Three-terminal Off-line PWM Switch
footprint DIP8
footprint SO8 (SOIC, 8-Leads, Body 4.9x3.9mm, Pitch 1.27mm, IPC High Density)
pins: 1 S, 2 S, 3 S, 4 C, 5 D, 6 S, 7 S, 8 S
text: 1-8

## TOP221-7Y
designator Q?, comment TOP223
Family Three-terminal Off-line PWM Switch; Value: IRF840
footprint TO220H1 (TO-220 - 1-2-3)
footprint TO220-123 (TO-220 - 1-2-3)
footprint TO220NH (TO-220 - 1-2-3)
footprint TO220H3 (TO-220 1-2-3)
footprint TO220H2 (TO-220 - 1-2-3)
pins: 1 C, 2 C, 3 C
text: D; S

## TouchPanel
designator T?
4 wires touch panel; Creator: Nguyen Ba Bien; Date Created: 14-04-2010
footprint JP6-D1T (6 pins, 1 row, straight, gold plating)
footprint JP6-C1T (6 row, straight, gold plating)
pins: 1 X+, 2 Y+, 3 X-, 4 Y-

## TP223
designator *
footprint SOT23-6
pins: 1 OUT, 2 GND, 3 TOUCH (in), 4 H/L Output, 5 VCC, 6 ON-OFF

## TP4056
designator IC?
footprint SO8 (SOIC, 8-Leads, Body 4.9x3.9mm, Pitch 1.27mm, IPC High Density)
pins: 1 Temp, 2 Prog, 3 GND, 4 VCC, 5 BAT, 6 Stanby, 7 Charge, 8 CE

## TP5100
designator Module?, comment 2A Charger  (value not drawn)
footprint TP5100 (2A Lion Charger)
pins: 1 GND, 2 VOUT, 3 VIN, 4 GND

## TP_SPRING
designator J?, comment Connector Spring  (value not drawn)
Connector SPRING Height 12mm; MPN: MP512-11 44; MFR: China; URL: *
footprint SPRING (Connector Spring)
pins: 1 (power)

## TPA3110D2
designator IC?
footprint HTSSOP28 (HTSSOP, 28-Leads, Body 9.8x4.5mm, Pitch 0.65mm, IPC High Density)
pins: 1 SD, 2 FAULT, 3 LINP, 4 LINN, 5 GAIN0, 6 GAIN1, 7 AVCC, 8 AGND, 9 GVDD, 10 PLIMIT, 11 RINN, 12 RINP, 14 PBTL, 15,26,27,28 PVCC, 17 BSP, 18 OUTP, 19,24,29 GND, 20 OUTP, 21 BSP, 22 BSN, 23 OUTN, 25 OUTN, 26 BSN
